# Altium integrated library Rosenberger HSD.IntLib: 118 symbols (part 1 of 2)
Pins are listed as number, name and electrical type; pins without a type are passive.

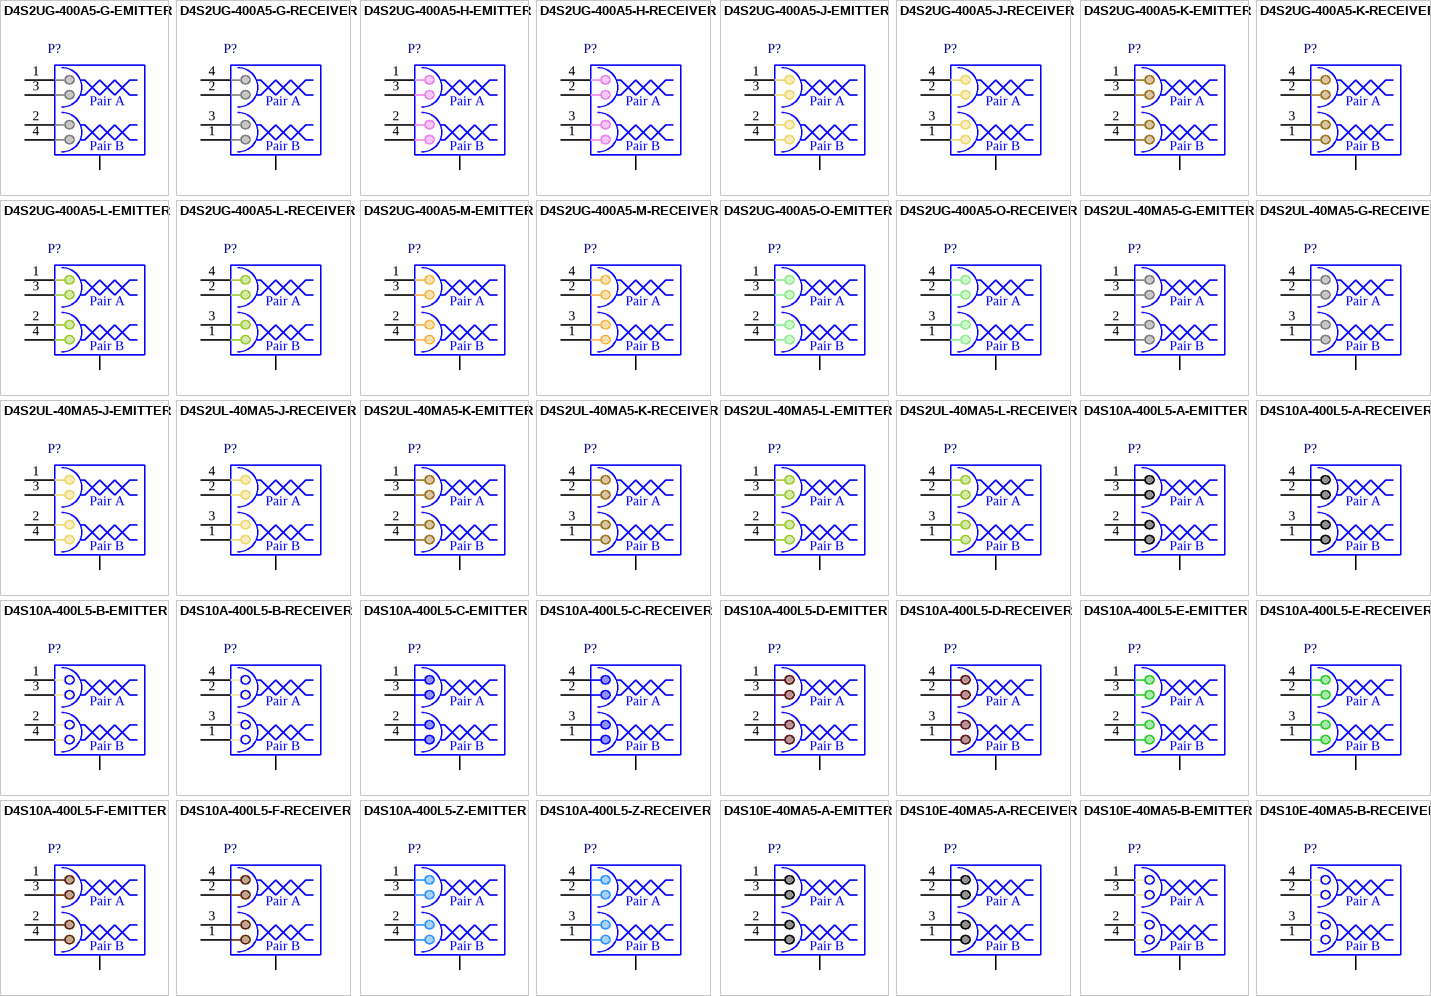
[diagram p0: symbols D4S2UG-400A5-G-EMITTER to D4S10E-40MA5-B-RECEIVER]

## D4S2UG-400A5-G-EMITTER
designator P?
HSD Right Angle Plug, Edge Mount, Upside Down, Coding G (Grey), Up to 5 GBit/s Per Pair, Emitter Side; PartNumber: D4S2UG-400A5-G-EMITTER; Design Note 1: Footprint in library is a generic example - only application specific footprint delivers High Performance; Design Note 2: A HSD 1-to-1 connection always needs an Emitter AND Receiver symbol, because the cable has a A->B direction, the pinning must be crossed.; DatasheetVersion: b00; PackageVersion: b00; PackageReference: D4S2UG-400A5-G; PackageDescription: HSD Plug, Right Angle, Edge Mount, Upside Down, 27.2 x 12 x 10.6 mm; Coding: G (Grey); Mounting Technology: Through Hole; ComponentLink1Description: Manufacturer URL; ComponentLink1URL: http://www.rosenberger.de; ComponentLink2Description: Datasheet; ComponentLink2URL: http://rosenberger.de/ok/images/documents/db/D4S2UG-400A5-Y.pdf; ComponentLink3Description: Package Specification; ComponentLink3URL: http://rosenberger.de/ok/images/documents/db/D4S2UG-400A5-Y.pdf; ComponentLink4Description: Series Overview / Design Note; ComponentLink4URL: http://rosenberger.de/ok/images/documents/spez/hsd.pdf; ComponentLink5Description: Webshop / RFQ; ComponentLink5URL: http://www.rosenberger.com/en/contact/sales/
footprint ROS-D4S2UG-400A5-G_V (HSD Plug, Right Angle, Edge Mount, Upside Down, 27.2x12x10.6mm, Rosenberger Recommended)
pins: 1, 2, 3, 4, MH
text: Pair A; Pair B

## D4S2UG-400A5-G-RECEIVER
designator P?
HSD Right Angle Plug, Edge Mount, Upside Down, Coding G (Grey), Up to 5 GBit/s Per Pair, Receiver Side; PartNumber: D4S2UG-400A5-G-RECEIVER; Design Note 1: Footprint in library is a generic example - only application specific footprint delivers High Performance; Design Note 2: A HSD 1-to-1 connection always needs an Emitter AND Receiver symbol, because the cable has a A->B direction, the pinning must be crossed.; DatasheetVersion: b00; PackageVersion: b00; PackageReference: D4S2UG-400A5-G; PackageDescription: HSD Plug, Right Angle, Edge Mount, Upside Down, 27.2 x 12 x 10.6 mm; Coding: G (Grey); Mounting Technology: Through Hole; ComponentLink1Description: Manufacturer URL; ComponentLink1URL: http://www.rosenberger.de; ComponentLink2Description: Datasheet; ComponentLink2URL: http://rosenberger.de/ok/images/documents/db/D4S2UG-400A5-Y.pdf; ComponentLink3Description: Package Specification; ComponentLink3URL: http://rosenberger.de/ok/images/documents/db/D4S2UG-400A5-Y.pdf; ComponentLink4Description: Series Overview / Design Note; ComponentLink4URL: http://rosenberger.de/ok/images/documents/spez/hsd.pdf; ComponentLink5Description: Webshop / RFQ; ComponentLink5URL: http://www.rosenberger.com/en/contact/sales/
footprint ROS-D4S2UG-400A5-G_V (HSD Plug, Right Angle, Edge Mount, Upside Down, 27.2x12x10.6mm, Rosenberger Recommended)
pins: 1, 2, 3, 4, MH
text: Pair A; Pair B

## D4S2UG-400A5-H-EMITTER
designator P?
HSD Right Angle Plug, Edge Mount, Upside Down, Coding H (Violet), Up to 5 GBit/s Per Pair, Emitter Side; PartNumber: D4S2UG-400A5-H-EMITTER; Design Note 1: Footprint in library is a generic example - only application specific footprint delivers High Performance; Design Note 2: A HSD 1-to-1 connection always needs an Emitter AND Receiver symbol, because the cable has a A->B direction, the pinning must be crossed.; DatasheetVersion: b00; PackageVersion: b00; PackageReference: D4S2UG-400A5-H; PackageDescription: HSD Plug, Right Angle, Edge Mount, Upside Down, 27.2 x 12 x 10.6 mm; Coding: H (Violet); Mounting Technology: Through Hole; ComponentLink1Description: Manufacturer URL; ComponentLink1URL: http://www.rosenberger.de; ComponentLink2Description: Datasheet; ComponentLink2URL: http://rosenberger.de/ok/images/documents/db/D4S2UG-400A5-Y.pdf; ComponentLink3Description: Package Specification; ComponentLink3URL: http://rosenberger.de/ok/images/documents/db/D4S2UG-400A5-Y.pdf; ComponentLink4Description: Series Overview / Design Note; ComponentLink4URL: http://rosenberger.de/ok/images/documents/spez/hsd.pdf; ComponentLink5Description: Webshop / RFQ; ComponentLink5URL: http://www.rosenberger.com/en/contact/sales/
footprint ROS-D4S2UG-400A5-H_V (HSD Plug, Right Angle, Edge Mount, Upside Down, 27.2x12x10.6mm, Rosenberger Recommended)
pins: 1, 2, 3, 4, MH
text: Pair A; Pair B

## D4S2UG-400A5-H-RECEIVER
designator P?
HSD Right Angle Plug, Edge Mount, Upside Down, Coding H (Violet), Up to 5 GBit/s Per Pair, Receiver Side; PartNumber: D4S2UG-400A5-H-RECEIVER; Design Note 1: Footprint in library is a generic example - only application specific footprint delivers High Performance; Design Note 2: A HSD 1-to-1 connection always needs an Emitter AND Receiver symbol, because the cable has a A->B direction, the pinning must be crossed.; DatasheetVersion: b00; PackageVersion: b00; PackageReference: D4S2UG-400A5-H; PackageDescription: HSD Plug, Right Angle, Edge Mount, Upside Down, 27.2 x 12 x 10.6 mm; Coding: H (Violet); Mounting Technology: Through Hole; ComponentLink1Description: Manufacturer URL; ComponentLink1URL: http://www.rosenberger.de; ComponentLink2Description: Datasheet; ComponentLink2URL: http://rosenberger.de/ok/images/documents/db/D4S2UG-400A5-Y.pdf; ComponentLink3Description: Package Specification; ComponentLink3URL: http://rosenberger.de/ok/images/documents/db/D4S2UG-400A5-Y.pdf; ComponentLink4Description: Series Overview / Design Note; ComponentLink4URL: http://rosenberger.de/ok/images/documents/spez/hsd.pdf; ComponentLink5Description: Webshop / RFQ; ComponentLink5URL: http://www.rosenberger.com/en/contact/sales/
footprint ROS-D4S2UG-400A5-H_V (HSD Plug, Right Angle, Edge Mount, Upside Down, 27.2x12x10.6mm, Rosenberger Recommended)
pins: 1, 2, 3, 4, MH
text: Pair A; Pair B

## D4S2UG-400A5-J-EMITTER
designator P?
HSD Right Angle Plug, Edge Mount, Upside Down, Coding J (Beige), Up to 5 GBit/s Per Pair, Emitter Side; PartNumber: D4S2UG-400A5-J-EMITTER; Design Note 1: Footprint in library is a generic example - only application specific footprint delivers High Performance; Design Note 2: A HSD 1-to-1 connection always needs an Emitter AND Receiver symbol, because the cable has a A->B direction, the pinning must be crossed.; DatasheetVersion: b00; PackageVersion: b00; PackageReference: D4S2UG-400A5-J; PackageDescription: HSD Plug, Right Angle, Edge Mount, Upside Down, 27.2 x 12 x 10.6 mm; Coding: J (Beige); Mounting Technology: Through Hole; ComponentLink1Description: Manufacturer URL; ComponentLink1URL: http://www.rosenberger.de; ComponentLink2Description: Datasheet; ComponentLink2URL: http://rosenberger.de/ok/images/documents/db/D4S2UG-400A5-Y.pdf; ComponentLink3Description: Package Specification; ComponentLink3URL: http://rosenberger.de/ok/images/documents/db/D4S2UG-400A5-Y.pdf; ComponentLink4Description: Series Overview / Design Note; ComponentLink4URL: http://rosenberger.de/ok/images/documents/spez/hsd.pdf; ComponentLink5Description: Webshop / RFQ; ComponentLink5URL: http://www.rosenberger.com/en/contact/sales/
footprint ROS-D4S2UG-400A5-J_V (HSD Plug, Right Angle, Edge Mount, Upside Down, 27.2x12x10.6mm, Rosenberger Recommended)
pins: 1, 2, 3, 4, MH
text: Pair A; Pair B

## D4S2UG-400A5-J-RECEIVER
designator P?
HSD Right Angle Plug, Edge Mount, Upside Down, Coding J (Beige), Up to 5 GBit/s Per Pair, Receiver Side; PartNumber: D4S2UG-400A5-J-RECEIVER; Design Note 1: Footprint in library is a generic example - only application specific footprint delivers High Performance; Design Note 2: A HSD 1-to-1 connection always needs an Emitter AND Receiver symbol, because the cable has a A->B direction, the pinning must be crossed.; DatasheetVersion: b00; PackageVersion: b00; PackageReference: D4S2UG-400A5-J; PackageDescription: HSD Plug, Right Angle, Edge Mount, Upside Down, 27.2 x 12 x 10.6 mm; Coding: J (Beige); Mounting Technology: Through Hole; ComponentLink1Description: Manufacturer URL; ComponentLink1URL: http://www.rosenberger.de; ComponentLink2Description: Datasheet; ComponentLink2URL: http://rosenberger.de/ok/images/documents/db/D4S2UG-400A5-Y.pdf; ComponentLink3Description: Package Specification; ComponentLink3URL: http://rosenberger.de/ok/images/documents/db/D4S2UG-400A5-Y.pdf; ComponentLink4Description: Series Overview / Design Note; ComponentLink4URL: http://rosenberger.de/ok/images/documents/spez/hsd.pdf; ComponentLink5Description: Webshop / RFQ; ComponentLink5URL: http://www.rosenberger.com/en/contact/sales/
footprint ROS-D4S2UG-400A5-J_V (HSD Plug, Right Angle, Edge Mount, Upside Down, 27.2x12x10.6mm, Rosenberger Recommended)
pins: 1, 2, 3, 4, MH
text: Pair A; Pair B

## D4S2UG-400A5-K-EMITTER
designator P?
HSD Right Angle Plug, Edge Mount, Upside Down, Coding K (Curry), Up to 5 GBit/s Per Pair, Emitter Side; PartNumber: D4S2UG-400A5-K-EMITTER; Design Note 1: Footprint in library is a generic example - only application specific footprint delivers High Performance; Design Note 2: A HSD 1-to-1 connection always needs an Emitter AND Receiver symbol, because the cable has a A->B direction, the pinning must be crossed.; DatasheetVersion: b00; PackageVersion: b00; PackageReference: D4S2UG-400A5-K; PackageDescription: HSD Plug, Right Angle, Edge Mount, Upside Down, 27.2 x 12 x 10.6 mm; Coding: K (Curry); Mounting Technology: Through Hole; ComponentLink1Description: Manufacturer URL; ComponentLink1URL: http://www.rosenberger.de; ComponentLink2Description: Datasheet; ComponentLink2URL: http://rosenberger.de/ok/images/documents/db/D4S2UG-400A5-Y.pdf; ComponentLink3Description: Package Specification; ComponentLink3URL: http://rosenberger.de/ok/images/documents/db/D4S2UG-400A5-Y.pdf; ComponentLink4Description: Series Overview / Design Note; ComponentLink4URL: http://rosenberger.de/ok/images/documents/spez/hsd.pdf; ComponentLink5Description: Webshop / RFQ; ComponentLink5URL: http://www.rosenberger.com/en/contact/sales/
footprint ROS-D4S2UG-400A5-K_V (HSD Plug, Right Angle, Edge Mount, Upside Down, 27.2x12x10.6mm, Rosenberger Recommended)
pins: 1, 2, 3, 4, MH
text: Pair A; Pair B

## D4S2UG-400A5-K-RECEIVER
designator P?
HSD Right Angle Plug, Edge Mount, Upside Down, Coding K (Curry), Up to 5 GBit/s Per Pair, Receiver Side; PartNumber: D4S2UG-400A5-K-RECEIVER; Design Note 1: Footprint in library is a generic example - only application specific footprint delivers High Performance; Design Note 2: A HSD 1-to-1 connection always needs an Emitter AND Receiver symbol, because the cable has a A->B direction, the pinning must be crossed.; DatasheetVersion: b00; PackageVersion: b00; PackageReference: D4S2UG-400A5-K; PackageDescription: HSD Plug, Right Angle, Edge Mount, Upside Down, 27.2 x 12 x 10.6 mm; Coding: K (Curry); Mounting Technology: Through Hole; ComponentLink1Description: Manufacturer URL; ComponentLink1URL: http://www.rosenberger.de; ComponentLink2Description: Datasheet; ComponentLink2URL: http://rosenberger.de/ok/images/documents/db/D4S2UG-400A5-Y.pdf; ComponentLink3Description: Package Specification; ComponentLink3URL: http://rosenberger.de/ok/images/documents/db/D4S2UG-400A5-Y.pdf; ComponentLink4Description: Series Overview / Design Note; ComponentLink4URL: http://rosenberger.de/ok/images/documents/spez/hsd.pdf; ComponentLink5Description: Webshop / RFQ; ComponentLink5URL: http://www.rosenberger.com/en/contact/sales/
footprint ROS-D4S2UG-400A5-K_V (HSD Plug, Right Angle, Edge Mount, Upside Down, 27.2x12x10.6mm, Rosenberger Recommended)
pins: 1, 2, 3, 4, MH
text: Pair A; Pair B

## D4S2UG-400A5-L-EMITTER
designator P?
HSD Right Angle Plug, Edge Mount, Upside Down, Coding L (Yellow Green), Up to 5 GBit/s Per Pair, Emitter Side; PartNumber: D4S2UG-400A5-L-EMITTER; Design Note 1: Footprint in library is a generic example - only application specific footprint delivers High Performance; Design Note 2: A HSD 1-to-1 connection always needs an Emitter AND Receiver symbol, because the cable has a A->B direction, the pinning must be crossed.; DatasheetVersion: b00; PackageVersion: b00; PackageReference: D4S2UG-400A5-L; PackageDescription: HSD Plug, Right Angle, Edge Mount, Upside Down, 27.2 x 12 x 10.6 mm; Coding: L (Yellow Green); Mounting Technology: Through Hole; ComponentLink1Description: Manufacturer URL; ComponentLink1URL: http://www.rosenberger.de; ComponentLink2Description: Datasheet; ComponentLink2URL: http://rosenberger.de/ok/images/documents/db/D4S2UG-400A5-Y.pdf; ComponentLink3Description: Package Specification; ComponentLink3URL: http://rosenberger.de/ok/images/documents/db/D4S2UG-400A5-Y.pdf; ComponentLink4Description: Series Overview / Design Note; ComponentLink4URL: http://rosenberger.de/ok/images/documents/spez/hsd.pdf; ComponentLink5Description: Webshop / RFQ; ComponentLink5URL: http://www.rosenberger.com/en/contact/sales/
footprint ROS-D4S2UG-400A5-L_V (HSD Plug, Right Angle, Edge Mount, Upside Down, 27.2x12x10.6mm, Rosenberger Recommended)
pins: 1, 2, 3, 4, MH
text: Pair A; Pair B

## D4S2UG-400A5-L-RECEIVER
designator P?
HSD Right Angle Plug, Edge Mount, Upside Down, Coding L (Yellow Green), Up to 5 GBit/s Per Pair, Receiver Side; PartNumber: D4S2UG-400A5-L-RECEIVER; Design Note 1: Footprint in library is a generic example - only application specific footprint delivers High Performance; Design Note 2: A HSD 1-to-1 connection always needs an Emitter AND Receiver symbol, because the cable has a A->B direction, the pinning must be crossed.; DatasheetVersion: b00; PackageVersion: b00; PackageReference: D4S2UG-400A5-L; PackageDescription: HSD Plug, Right Angle, Edge Mount, Upside Down, 27.2 x 12 x 10.6 mm; Coding: L (Yellow Green); Mounting Technology: Through Hole; ComponentLink1Description: Manufacturer URL; ComponentLink1URL: http://www.rosenberger.de; ComponentLink2Description: Datasheet; ComponentLink2URL: http://rosenberger.de/ok/images/documents/db/D4S2UG-400A5-Y.pdf; ComponentLink3Description: Package Specification; ComponentLink3URL: http://rosenberger.de/ok/images/documents/db/D4S2UG-400A5-Y.pdf; ComponentLink4Description: Series Overview / Design Note; ComponentLink4URL: http://rosenberger.de/ok/images/documents/spez/hsd.pdf; ComponentLink5Description: Webshop / RFQ; ComponentLink5URL: http://www.rosenberger.com/en/contact/sales/
footprint ROS-D4S2UG-400A5-L_V (HSD Plug, Right Angle, Edge Mount, Upside Down, 27.2x12x10.6mm, Rosenberger Recommended)
pins: 1, 2, 3, 4, MH
text: Pair A; Pair B

## D4S2UG-400A5-M-EMITTER
designator P?
HSD Right Angle Plug, Edge Mount, Upside Down, Coding M (Pastel Orange), Up to 5 GBit/s Per Pair, Emitter Side; PartNumber: D4S2UG-400A5-M-EMITTER; Design Note 1: Footprint in library is a generic example - only application specific footprint delivers High Performance; Design Note 2: A HSD 1-to-1 connection always needs an Emitter AND Receiver symbol, because the cable has a A->B direction, the pinning must be crossed.; DatasheetVersion: b00; PackageVersion: b00; PackageReference: D4S2UG-400A5-M; PackageDescription: HSD Plug, Right Angle, Edge Mount, Upside Down, 27.2 x 12 x 10.6 mm; Coding: M (Pastel Orange); Mounting Technology: Through Hole; ComponentLink1Description: Manufacturer URL; ComponentLink1URL: http://www.rosenberger.de; ComponentLink2Description: Datasheet; ComponentLink2URL: http://rosenberger.de/ok/images/documents/db/D4S2UG-400A5-Y.pdf; ComponentLink3Description: Package Specification; ComponentLink3URL: http://rosenberger.de/ok/images/documents/db/D4S2UG-400A5-Y.pdf; ComponentLink4Description: Series Overview / Design Note; ComponentLink4URL: http://rosenberger.de/ok/images/documents/spez/hsd.pdf; ComponentLink5Description: Webshop / RFQ; ComponentLink5URL: http://www.rosenberger.com/en/contact/sales/
footprint ROS-D4S2UG-400A5-M_V (HSD Plug, Right Angle, Edge Mount, Upside Down, 27.2x12x10.6mm, Rosenberger Recommended)
pins: 1, 2, 3, 4, MH
text: Pair A; Pair B

## D4S2UG-400A5-M-RECEIVER
designator P?
HSD Right Angle Plug, Edge Mount, Upside Down, Coding M (Pastel Orange), Up to 5 GBit/s Per Pair, Receiver Side; PartNumber: D4S2UG-400A5-M-RECEIVER; Design Note 1: Footprint in library is a generic example - only application specific footprint delivers High Performance; Design Note 2: A HSD 1-to-1 connection always needs an Emitter AND Receiver symbol, because the cable has a A->B direction, the pinning must be crossed.; DatasheetVersion: b00; PackageVersion: b00; PackageReference: D4S2UG-400A5-M; PackageDescription: HSD Plug, Right Angle, Edge Mount, Upside Down, 27.2 x 12 x 10.6 mm; Coding: M (Pastel Orange); Mounting Technology: Through Hole; ComponentLink1Description: Manufacturer URL; ComponentLink1URL: http://www.rosenberger.de; ComponentLink2Description: Datasheet; ComponentLink2URL: http://rosenberger.de/ok/images/documents/db/D4S2UG-400A5-Y.pdf; ComponentLink3Description: Package Specification; ComponentLink3URL: http://rosenberger.de/ok/images/documents/db/D4S2UG-400A5-Y.pdf; ComponentLink4Description: Series Overview / Design Note; ComponentLink4URL: http://rosenberger.de/ok/images/documents/spez/hsd.pdf; ComponentLink5Description: Webshop / RFQ; ComponentLink5URL: http://www.rosenberger.com/en/contact/sales/
footprint ROS-D4S2UG-400A5-M_V (HSD Plug, Right Angle, Edge Mount, Upside Down, 27.2x12x10.6mm, Rosenberger Recommended)
pins: 1, 2, 3, 4, MH
text: Pair A; Pair B

## D4S2UG-400A5-O-EMITTER
designator P?
HSD Right Angle Plug, Edge Mount, Upside Down, Coding O (Light Green), Up to 5 GBit/s Per Pair, Emitter Side; PartNumber: D4S2UG-400A5-O-EMITTER; Design Note 1: Footprint in library is a generic example - only application specific footprint delivers High Performance; Design Note 2: A HSD 1-to-1 connection always needs an Emitter AND Receiver symbol, because the cable has a A->B direction, the pinning must be crossed.; DatasheetVersion: b00; PackageVersion: b00; PackageReference: D4S2UG-400A5-O; PackageDescription: HSD Plug, Right Angle, Edge Mount, Upside Down, 27.2 x 12 x 10.6 mm; Coding: O (Light Green); Mounting Technology: Through Hole; ComponentLink1Description: Manufacturer URL; ComponentLink1URL: http://www.rosenberger.de; ComponentLink2Description: Datasheet; ComponentLink2URL: http://rosenberger.de/ok/images/documents/db/D4S2UG-400A5-Y.pdf; ComponentLink3Description: Package Specification; ComponentLink3URL: http://rosenberger.de/ok/images/documents/db/D4S2UG-400A5-Y.pdf; ComponentLink4Description: Series Overview / Design Note; ComponentLink4URL: http://rosenberger.de/ok/images/documents/spez/hsd.pdf; ComponentLink5Description: Webshop / RFQ; ComponentLink5URL: http://www.rosenberger.com/en/contact/sales/
footprint ROS-D4S2UG-400A5-O_V (HSD Plug, Right Angle, Edge Mount, Upside Down, 27.2x12x10.6mm, Rosenberger Recommended)
pins: 1, 2, 3, 4, MH
text: Pair A; Pair B

## D4S2UG-400A5-O-RECEIVER
designator P?
HSD Right Angle Plug, Edge Mount, Upside Down, Coding O (Light Green), Up to 5 GBit/s Per Pair, Receiver Side; PartNumber: D4S2UG-400A5-O-RECEIVER; Design Note 1: Footprint in library is a generic example - only application specific footprint delivers High Performance; Design Note 2: A HSD 1-to-1 connection always needs an Emitter AND Receiver symbol, because the cable has a A->B direction, the pinning must be crossed.; DatasheetVersion: b00; PackageVersion: b00; PackageReference: D4S2UG-400A5-O; PackageDescription: HSD Plug, Right Angle, Edge Mount, Upside Down, 27.2 x 12 x 10.6 mm; Coding: O (Light Green); Mounting Technology: Through Hole; ComponentLink1Description: Manufacturer URL; ComponentLink1URL: http://www.rosenberger.de; ComponentLink2Description: Datasheet; ComponentLink2URL: http://rosenberger.de/ok/images/documents/db/D4S2UG-400A5-Y.pdf; ComponentLink3Description: Package Specification; ComponentLink3URL: http://rosenberger.de/ok/images/documents/db/D4S2UG-400A5-Y.pdf; ComponentLink4Description: Series Overview / Design Note; ComponentLink4URL: http://rosenberger.de/ok/images/documents/spez/hsd.pdf; ComponentLink5Description: Webshop / RFQ; ComponentLink5URL: http://www.rosenberger.com/en/contact/sales/
footprint ROS-D4S2UG-400A5-O_V (HSD Plug, Right Angle, Edge Mount, Upside Down, 27.2x12x10.6mm, Rosenberger Recommended)
pins: 1, 2, 3, 4, MH
text: Pair A; Pair B

## D4S2UL-40MA5-G-EMITTER
designator P?
HSD Right Angle Plug, Edge Mount Pin in Paste, Upside Down, Coding G (Grey), Up to 5 GBit/s Per Pair, Emitter Side; PartNumber: D4S2UL-40MA5-G-EMITTER; Design Note 1: Footprint in library is a generic example - only application specific footprint delivers High Performance; Design Note 2: A HSD 1-to-1 connection always needs an Emitter AND Receiver symbol, because the cable has a A->B direction, the pinning must be crossed.; DatasheetVersion: b00; PackageVersion: b00; PackageReference: D4S2UL-40MA5-G; PackageDescription: HSD Right Angle Plug, Edge Mount Pin in Paste, Upside Down, 27.3 x 12 x 6.95 mm; Coding: G (Grey); Mounting Technology: Pin-in-Paste; ComponentLink1Description: Manufacturer URL; ComponentLink1URL: http://www.rosenberger.de; ComponentLink2Description: Datasheet; ComponentLink2URL: http://rosenberger.de/ok/images/documents/db/D4S2UL-40MA5-Y.pdf; ComponentLink3Description: Package Specification; ComponentLink3URL: http://rosenberger.de/ok/images/documents/db/D4S2UL-40MA5-Y.pdf; ComponentLink4Description: Series Overview / Design Note; ComponentLink4URL: http://rosenberger.de/ok/images/documents/spez/hsd.pdf; ComponentLink5Description: Webshop / RFQ; ComponentLink5URL: http://www.rosenberger.com/en/contact/sales/
footprint ROS-D4S2UL-40MA5-G_V (HSD Right Angle Plug, Edge Mount Pin in Paste, Upside Down, 27.3x12x6.95mm, Rosenberger Recommended)
pins: 1, 2, 3, 4, MH
text: Pair A; Pair B

## D4S2UL-40MA5-G-RECEIVER
designator P?
HSD Right Angle Plug, Edge Mount Pin in Paste, Upside Down, Coding G (Grey),  Up to 5 GBit/s Per Pair, Receiver Side; PartNumber: D4S2UL-40MA5-G-RECEIVER; Design Note 1: Footprint in library is a generic example - only application specific footprint delivers High Performance; Design Note 2: A HSD 1-to-1 connection always needs an Emitter AND Receiver symbol, because the cable has a A->B direction, the pinning must be crossed.; DatasheetVersion: b00; PackageVersion: b00; PackageReference: D4S2UL-40MA5-G; PackageDescription: HSD Right Angle Plug, Edge Mount Pin in Paste, Upside Down, 27.3 x 12 x 6.95 mm; Coding: G (Grey); Mounting Technology: Pin-in-Paste; ComponentLink1Description: Manufacturer URL; ComponentLink1URL: http://www.rosenberger.de; ComponentLink2Description: Datasheet; ComponentLink2URL: http://rosenberger.de/ok/images/documents/db/D4S2UL-40MA5-Y.pdf; ComponentLink3Description: Package Specification; ComponentLink3URL: http://rosenberger.de/ok/images/documents/db/D4S2UL-40MA5-Y.pdf; ComponentLink4Description: Series Overview / Design Note; ComponentLink4URL: http://rosenberger.de/ok/images/documents/spez/hsd.pdf; ComponentLink5Description: Webshop / RFQ; ComponentLink5URL: http://www.rosenberger.com/en/contact/sales/
footprint ROS-D4S2UL-40MA5-G_V (HSD Right Angle Plug, Edge Mount Pin in Paste, Upside Down, 27.3x12x6.95mm, Rosenberger Recommended)
pins: 1, 2, 3, 4, MH
text: Pair A; Pair B

## D4S2UL-40MA5-J-EMITTER
designator P?
HSD Right Angle Plug, Edge Mount Pin in Paste, Upside Down, Coding J (Beige),  Up to 5 GBit/s Per Pair, Emitter Side; PartNumber: D4S2UL-40MA5-J-EMITTER; Design Note 1: Footprint in library is a generic example - only application specific footprint delivers High Performance; Design Note 2: A HSD 1-to-1 connection always needs an Emitter AND Receiver symbol, because the cable has a A->B direction, the pinning must be crossed.; DatasheetVersion: b00; PackageVersion: b00; PackageReference: D4S2UL-40MA5-J; PackageDescription: HSD Right Angle Plug, Edge Mount Pin in Paste, Upside Down, 27.3 x 12 x 6.95 mm; Coding: J (Beige); Mounting Technology: Pin-in-Paste; ComponentLink1Description: Manufacturer URL; ComponentLink1URL: http://www.rosenberger.de; ComponentLink2Description: Datasheet; ComponentLink2URL: http://rosenberger.de/ok/images/documents/db/D4S2UL-40MA5-Y.pdf; ComponentLink3Description: Package Specification; ComponentLink3URL: http://rosenberger.de/ok/images/documents/db/D4S2UL-40MA5-Y.pdf; ComponentLink4Description: Series Overview / Design Note; ComponentLink4URL: http://rosenberger.de/ok/images/documents/spez/hsd.pdf; ComponentLink5Description: Webshop / RFQ; ComponentLink5URL: http://www.rosenberger.com/en/contact/sales/
footprint ROS-D4S2UL-40MA5-J_V (HSD Right Angle Plug, Edge Mount Pin in Paste, Upside Down, 27.3x12x6.95mm, Rosenberger Recommended)
pins: 1, 2, 3, 4, MH
text: Pair A; Pair B

## D4S2UL-40MA5-J-RECEIVER
designator P?
HSD Right Angle Plug, Edge Mount Pin in Paste, Upside Down, Coding J (Beige), Up to 5 GBit/s Per Pair, Receiver Side; PartNumber: D4S2UL-40MA5-J-RECEIVER; Design Note 1: Footprint in library is a generic example - only application specific footprint delivers High Performance; Design Note 2: A HSD 1-to-1 connection always needs an Emitter AND Receiver symbol, because the cable has a A->B direction, the pinning must be crossed.; DatasheetVersion: b00; PackageVersion: b00; PackageReference: D4S2UL-40MA5-J; PackageDescription: HSD Right Angle Plug, Edge Mount Pin in Paste, Upside Down, 27.3 x 12 x 6.95 mm; Coding: J (Beige); Mounting Technology: Pin-in-Paste; ComponentLink1Description: Manufacturer URL; ComponentLink1URL: http://www.rosenberger.de; ComponentLink2Description: Datasheet; ComponentLink2URL: http://rosenberger.de/ok/images/documents/db/D4S2UL-40MA5-Y.pdf; ComponentLink3Description: Package Specification; ComponentLink3URL: http://rosenberger.de/ok/images/documents/db/D4S2UL-40MA5-Y.pdf; ComponentLink4Description: Series Overview / Design Note; ComponentLink4URL: http://rosenberger.de/ok/images/documents/spez/hsd.pdf; ComponentLink5Description: Webshop / RFQ; ComponentLink5URL: http://www.rosenberger.com/en/contact/sales/
footprint ROS-D4S2UL-40MA5-J_V (HSD Right Angle Plug, Edge Mount Pin in Paste, Upside Down, 27.3x12x6.95mm, Rosenberger Recommended)
pins: 1, 2, 3, 4, MH
text: Pair A; Pair B

## D4S2UL-40MA5-K-EMITTER
designator P?
HSD Right Angle Plug, Edge Mount Pin in Paste, Upside Down, Coding K (Curry),  Up to 5 GBit/s Per Pair, Emitter Side; PartNumber: D4S2UL-40MA5-K-EMITTER; Design Note 1: Footprint in library is a generic example - only application specific footprint delivers High Performance; Design Note 2: A HSD 1-to-1 connection always needs an Emitter AND Receiver symbol, because the cable has a A->B direction, the pinning must be crossed.; DatasheetVersion: b00; PackageVersion: b00; PackageReference: D4S2UL-40MA5-K; PackageDescription: HSD Right Angle Plug, Edge Mount Pin in Paste, Upside Down, 27.3 x 12 x 6.95 mm; Coding: K (Curry); Mounting Technology: Pin-in-Paste; ComponentLink1Description: Manufacturer URL; ComponentLink1URL: http://www.rosenberger.de; ComponentLink2Description: Datasheet; ComponentLink2URL: http://rosenberger.de/ok/images/documents/db/D4S2UL-40MA5-Y.pdf; ComponentLink3Description: Package Specification; ComponentLink3URL: http://rosenberger.de/ok/images/documents/db/D4S2UL-40MA5-Y.pdf; ComponentLink4Description: Series Overview / Design Note; ComponentLink4URL: http://rosenberger.de/ok/images/documents/spez/hsd.pdf; ComponentLink5Description: Webshop / RFQ; ComponentLink5URL: http://www.rosenberger.com/en/contact/sales/
footprint ROS-D4S2UL-40MA5-K_V (HSD Right Angle Plug, Edge Mount Pin in Paste, Upside Down, 27.3x12x6.95mm, Rosenberger Recommended)
pins: 1, 2, 3, 4, MH
text: Pair A; Pair B

## D4S2UL-40MA5-K-RECEIVER
designator P?
HSD Right Angle Plug, Edge Mount Pin in Paste, Upside Down, Coding K (Curry),  Up to 5 GBit/s Per Pair, Receiver Side; PartNumber: D4S2UL-40MA5-K-RECEIVER; Design Note 1: Footprint in library is a generic example - only application specific footprint delivers High Performance; Design Note 2: A HSD 1-to-1 connection always needs an Emitter AND Receiver symbol, because the cable has a A->B direction, the pinning must be crossed.; DatasheetVersion: b00; PackageVersion: b00; PackageReference: D4S2UL-40MA5-K; PackageDescription: HSD Right Angle Plug, Edge Mount Pin in Paste, Upside Down, 27.3 x 12 x 6.95 mm; Coding: K (Curry); Mounting Technology: Pin-in-Paste; ComponentLink1Description: Manufacturer URL; ComponentLink1URL: http://www.rosenberger.de; ComponentLink2Description: Datasheet; ComponentLink2URL: http://rosenberger.de/ok/images/documents/db/D4S2UL-40MA5-Y.pdf; ComponentLink3Description: Package Specification; ComponentLink3URL: http://rosenberger.de/ok/images/documents/db/D4S2UL-40MA5-Y.pdf; ComponentLink4Description: Series Overview / Design Note; ComponentLink4URL: http://rosenberger.de/ok/images/documents/spez/hsd.pdf; ComponentLink5Description: Webshop / RFQ; ComponentLink5URL: http://www.rosenberger.com/en/contact/sales/
footprint ROS-D4S2UL-40MA5-K_V (HSD Right Angle Plug, Edge Mount Pin in Paste, Upside Down, 27.3x12x6.95mm, Rosenberger Recommended)
pins: 1, 2, 3, 4, MH
text: Pair A; Pair B

## D4S2UL-40MA5-L-EMITTER
designator P?
HSD Right Angle Plug, Edge Mount Pin in Paste, Upside Down, Coding L (Yellow Green),  Up to 5 GBit/s Per Pair, Emitter Side; PartNumber: D4S2UL-40MA5-L-EMITTER; Design Note 1: Footprint in library is a generic example - only application specific footprint delivers High Performance; Design Note 2: A HSD 1-to-1 connection always needs an Emitter AND Receiver symbol, because the cable has a A->B direction, the pinning must be crossed.; DatasheetVersion: b00; PackageVersion: b00; PackageReference: D4S2UL-40MA5-L; PackageDescription: HSD Right Angle Plug, Edge Mount Pin in Paste, Upside Down, 27.3 x 12 x 6.95 mm; Coding: L (Yellow Green); Mounting Technology: Pin-in-Paste; ComponentLink1Description: Manufacturer URL; ComponentLink1URL: http://www.rosenberger.de; ComponentLink2Description: Datasheet; ComponentLink2URL: http://rosenberger.de/ok/images/documents/db/D4S2UL-40MA5-Y.pdf; ComponentLink3Description: Package Specification; ComponentLink3URL: http://rosenberger.de/ok/images/documents/db/D4S2UL-40MA5-Y.pdf; ComponentLink4Description: Series Overview / Design Note; ComponentLink4URL: http://rosenberger.de/ok/images/documents/spez/hsd.pdf; ComponentLink5Description: Webshop / RFQ; ComponentLink5URL: http://www.rosenberger.com/en/contact/sales/
footprint ROS-D4S2UL-40MA5-L_V (HSD Right Angle Plug, Edge Mount Pin in Paste, Upside Down, 27.3x12x6.95mm, Rosenberger Recommended)
pins: 1, 2, 3, 4, MH
text: Pair A; Pair B

## D4S2UL-40MA5-L-RECEIVER
designator P?
HSD Right Angle Plug, Edge Mount Pin in Paste, Upside Down, Coding L (Yellow Green),  Up to 5 GBit/s Per Pair, Receiver Side; PartNumber: D4S2UL-40MA5-L-RECEIVER; Design Note 1: Footprint in library is a generic example - only application specific footprint delivers High Performance; Design Note 2: A HSD 1-to-1 connection always needs an Emitter AND Receiver symbol, because the cable has a A->B direction, the pinning must be crossed.; DatasheetVersion: b00; PackageVersion: b00; PackageReference: D4S2UL-40MA5-L; PackageDescription: HSD Right Angle Plug, Edge Mount Pin in Paste, Upside Down, 27.3 x 12 x 6.95 mm; Coding: L (Yellow Green); Mounting Technology: Pin-in-Paste; ComponentLink1Description: Manufacturer URL; ComponentLink1URL: http://www.rosenberger.de; ComponentLink2Description: Datasheet; ComponentLink2URL: http://rosenberger.de/ok/images/documents/db/D4S2UL-40MA5-Y.pdf; ComponentLink3Description: Package Specification; ComponentLink3URL: http://rosenberger.de/ok/images/documents/db/D4S2UL-40MA5-Y.pdf; ComponentLink4Description: Series Overview / Design Note; ComponentLink4URL: http://rosenberger.de/ok/images/documents/spez/hsd.pdf; ComponentLink5Description: Webshop / RFQ; ComponentLink5URL: http://www.rosenberger.com/en/contact/sales/
footprint ROS-D4S2UL-40MA5-L_V (HSD Right Angle Plug, Edge Mount Pin in Paste, Upside Down, 27.3x12x6.95mm, Rosenberger Recommended)
pins: 1, 2, 3, 4, MH
text: Pair A; Pair B

## D4S10A-400L5-A-EMITTER
designator P?
HSD Straight Plug, Coding A (Black), Up to 5 GBit/s Per Pair, Emitter Side; PartNumber: D4S10A-400L5-A-EMITTER; Design Note 1: Footprint in library is a generic example - only application specific footprint delivers High Performance; Design Note 2: A HSD 1-to-1 connection always needs an Emitter AND Receiver symbol, because the cable has a A->B direction, the pinning must be crossed.; DatasheetVersion: 902; PackageVersion: 902; PackageReference: D4S10A-400L5-A; PackageDescription: HSD Straight Plug, 12 x 14.15 x 15.4 mm; Coding: A (Black); Mounting Technology: Through Hole; ComponentLink1Description: Manufacturer URL; ComponentLink1URL: http://www.rosenberger.de; ComponentLink2Description: Datasheet; ComponentLink2URL: http://rosenberger.de/ok/images/documents/db/D4S10A-400L5-Y.pdf; ComponentLink3Description: Package Specification; ComponentLink3URL: http://rosenberger.de/ok/images/documents/db/D4S10A-400L5-Y.pdf; ComponentLink4Description: Series Overview / Design Note; ComponentLink4URL: http://rosenberger.de/ok/images/documents/spez/hsd.pdf; ComponentLink5Description: Webshop / RFQ; ComponentLink5URL: http://www.rosenberger.com/en/contact/sales/
footprint ROS-D4S10A-400L5-A_V (HSD Straight Plug, 12x14.15x15.4mm, Rosenberger Recommended)
pins: 1, 2, 3, 4, MH
text: Pair A; Pair B

## D4S10A-400L5-A-RECEIVER
designator P?
HSD Straight Plug, Coding A (Black), Up to 5 GBit/s Per Pair, Receiver Side; PartNumber: D4S10A-400L5-A-RECEIVER; Design Note 1: Footprint in library is a generic example - only application specific footprint delivers High Performance; Design Note 2: A HSD 1-to-1 connection always needs an Emitter AND Receiver symbol, because the cable has a A->B direction, the pinning must be crossed.; DatasheetVersion: 902; PackageVersion: 902; PackageReference: D4S10A-400L5-A; PackageDescription: HSD Straight Plug, 12 x 14.15 x 15.4 mm; Coding: A (Black); Mounting Technology: Through Hole; ComponentLink1Description: Manufacturer URL; ComponentLink1URL: http://www.rosenberger.de; ComponentLink2Description: Datasheet; ComponentLink2URL: http://rosenberger.de/ok/images/documents/db/D4S10A-400L5-Y.pdf; ComponentLink3Description: Package Specification; ComponentLink3URL: http://rosenberger.de/ok/images/documents/db/D4S10A-400L5-Y.pdf; ComponentLink4Description: Series Overview / Design Note; ComponentLink4URL: http://rosenberger.de/ok/images/documents/spez/hsd.pdf; ComponentLink5Description: Webshop / RFQ; ComponentLink5URL: http://www.rosenberger.com/en/contact/sales/
footprint ROS-D4S10A-400L5-A_V (HSD Straight Plug, 12x14.15x15.4mm, Rosenberger Recommended)
pins: 1, 2, 3, 4, MH
text: Pair A; Pair B

## D4S10A-400L5-B-EMITTER
designator P?
HSD Straight Plug, Coding B (White), Up to 5 GBit/s Per Pair, Emitter Side; PartNumber: D4S10A-400L5-B-EMITTER; Design Note 1: Footprint in library is a generic example - only application specific footprint delivers High Performance; Design Note 2: A HSD 1-to-1 connection always needs an Emitter AND Receiver symbol, because the cable has a A->B direction, the pinning must be crossed.; DatasheetVersion: 902; PackageVersion: 902; PackageReference: D4S10A-400L5-B; PackageDescription: HSD Straight Plug, 12 x 14.15 x 15.4 mm; Coding: B (White); Mounting Technology: Through Hole; ComponentLink1Description: Manufacturer URL; ComponentLink1URL: http://www.rosenberger.de; ComponentLink2Description: Datasheet; ComponentLink2URL: http://rosenberger.de/ok/images/documents/db/D4S10A-400L5-Y.pdf; ComponentLink3Description: Package Specification; ComponentLink3URL: http://rosenberger.de/ok/images/documents/db/D4S10A-400L5-Y.pdf; ComponentLink4Description: Series Overview / Design Note; ComponentLink4URL: http://rosenberger.de/ok/images/documents/spez/hsd.pdf; ComponentLink5Description: Webshop / RFQ; ComponentLink5URL: http://www.rosenberger.com/en/contact/sales/
footprint ROS-D4S10A-400L5-B_V (HSD Straight Plug, 12x14.15x15.4mm, Rosenberger Recommended)
pins: 1, 2, 3, 4, MH
text: Pair A; Pair B

## D4S10A-400L5-B-RECEIVER
designator P?
HSD Straight Plug, Coding B (White), Up to 5 GBit/s Per Pair, Receiver Side; PartNumber: D4S10A-400L5-B-RECEIVER; Design Note 1: Footprint in library is a generic example - only application specific footprint delivers High Performance; Design Note 2: A HSD 1-to-1 connection always needs an Emitter AND Receiver symbol, because the cable has a A->B direction, the pinning must be crossed.; DatasheetVersion: 902; PackageVersion: 902; PackageReference: D4S10A-400L5-B; PackageDescription: HSD Straight Plug, 12 x 14.15 x 15.4 mm; Coding: B (White); Mounting Technology: Through Hole; ComponentLink1Description: Manufacturer URL; ComponentLink1URL: http://www.rosenberger.de; ComponentLink2Description: Datasheet; ComponentLink2URL: http://rosenberger.de/ok/images/documents/db/D4S10A-400L5-Y.pdf; ComponentLink3Description: Package Specification; ComponentLink3URL: http://rosenberger.de/ok/images/documents/db/D4S10A-400L5-Y.pdf; ComponentLink4Description: Series Overview / Design Note; ComponentLink4URL: http://rosenberger.de/ok/images/documents/spez/hsd.pdf; ComponentLink5Description: Webshop / RFQ; ComponentLink5URL: http://www.rosenberger.com/en/contact/sales/
footprint ROS-D4S10A-400L5-B_V (HSD Straight Plug, 12x14.15x15.4mm, Rosenberger Recommended)
pins: 1, 2, 3, 4, MH
text: Pair A; Pair B

## D4S10A-400L5-C-EMITTER
designator P?
HSD Straight Plug, Coding C (Blue), Up to 5 GBit/s Per Pair, Emitter Side; PartNumber: D4S10A-400L5-C-EMITTER; Design Note 1: Footprint in library is a generic example - only application specific footprint delivers High Performance; Design Note 2: A HSD 1-to-1 connection always needs an Emitter AND Receiver symbol, because the cable has a A->B direction, the pinning must be crossed.; DatasheetVersion: 902; PackageVersion: 902; PackageReference: D4S10A-400L5-C; PackageDescription: HSD Straight Plug, 12 x 14.15 x 15.4 mm; Coding: C (Blue); Mounting Technology: Through Hole; ComponentLink1Description: Manufacturer URL; ComponentLink1URL: http://www.rosenberger.de; ComponentLink2Description: Datasheet; ComponentLink2URL: http://rosenberger.de/ok/images/documents/db/D4S10A-400L5-Y.pdf; ComponentLink3Description: Package Specification; ComponentLink3URL: http://rosenberger.de/ok/images/documents/db/D4S10A-400L5-Y.pdf; ComponentLink4Description: Series Overview / Design Note; ComponentLink4URL: http://rosenberger.de/ok/images/documents/spez/hsd.pdf; ComponentLink5Description: Webshop / RFQ; ComponentLink5URL: http://www.rosenberger.com/en/contact/sales/
footprint ROS-D4S10A-400L5-C_V (HSD Straight Plug, 12x14.15x15.4mm, Rosenberger Recommended)
pins: 1, 2, 3, 4, MH
text: Pair A; Pair B

## D4S10A-400L5-C-RECEIVER
designator P?